# Altium footprint library 排针-排母-1.27.PcbLib: 152 footprints (part 3 of 10)
Each footprint in its own frame and in the unit in brackets; x right, y up, seen from the top. Pads: shape width x height; smd on the part's side, far side on the other; paste and mask are expansions set on the pad; w line width, h text height; cw(c..) or ccw(c..) is an arc to the next point about the centre after c.
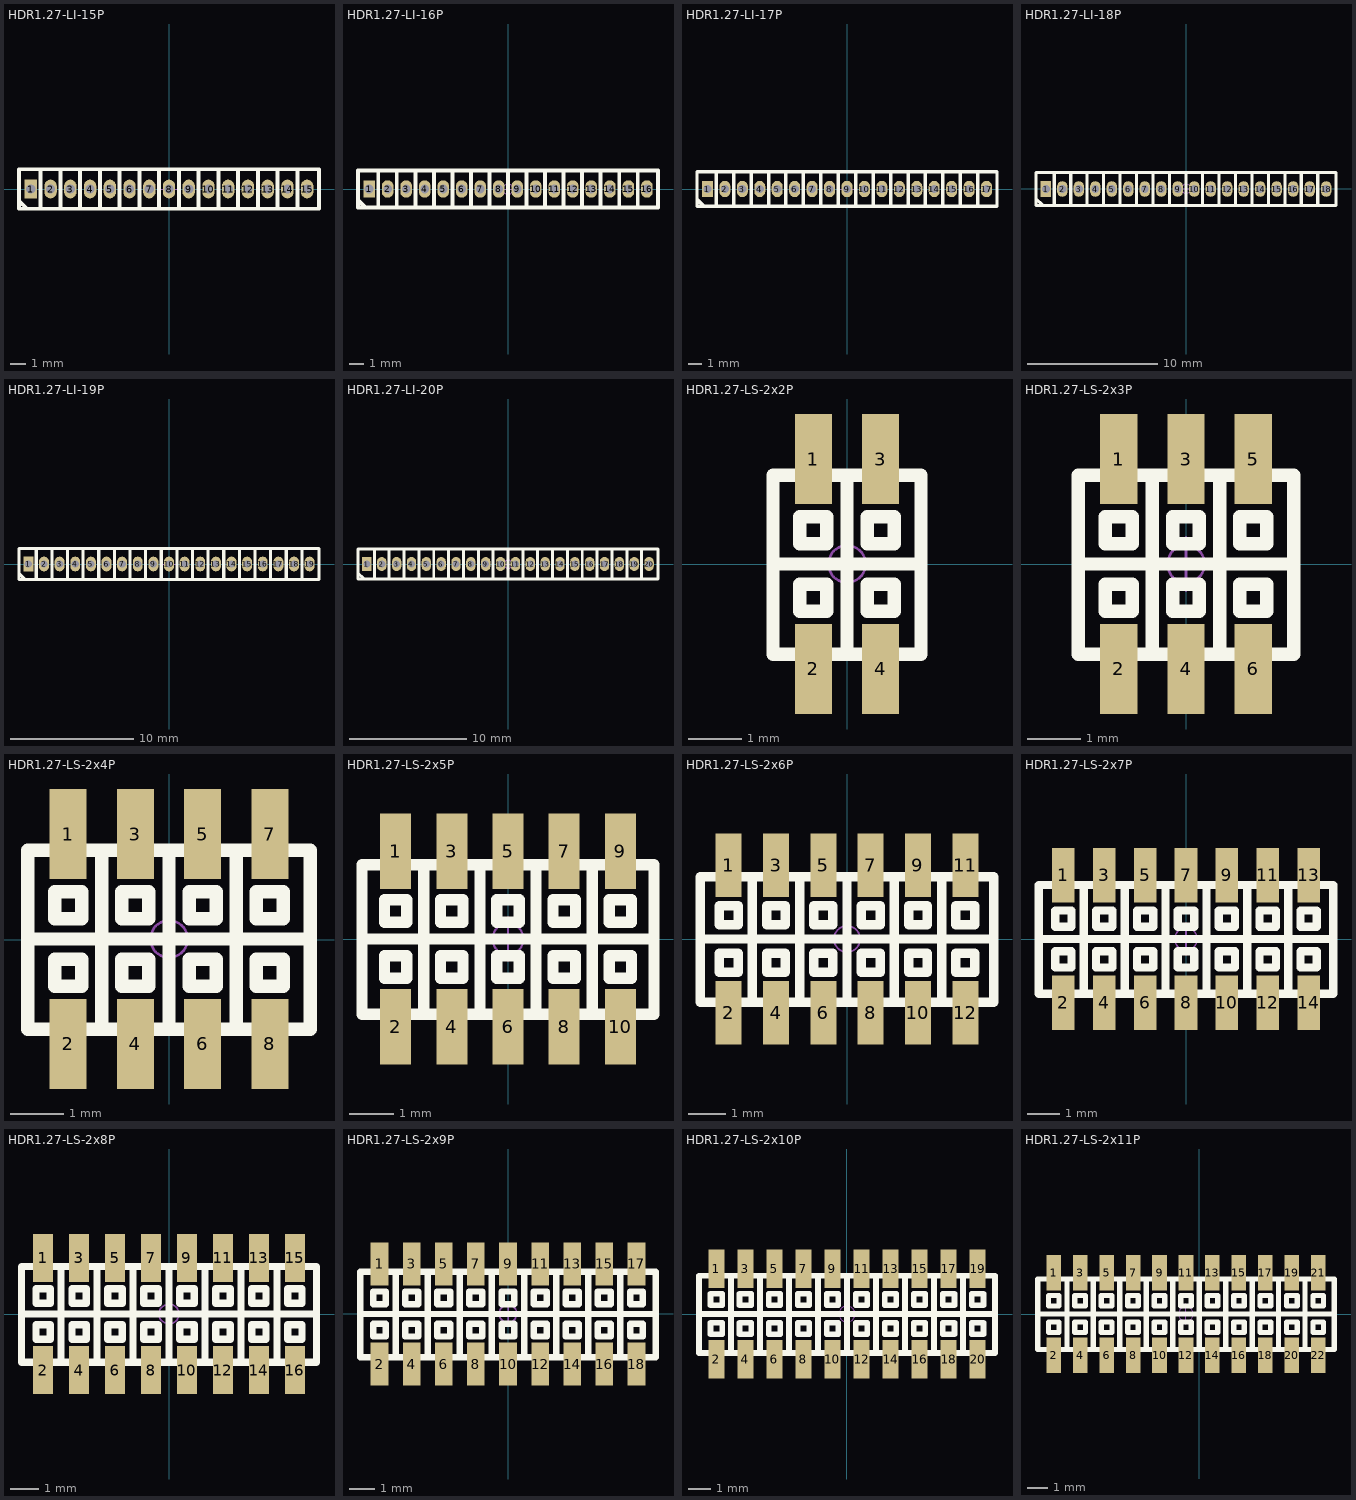
[diagram p2: the footprints below, top view; thin cyan lines are the x and y axes]

## HDR1.27-LI-15P [mm] "直插，脚距：1.27mm"
pads (15):
  rect 0.8x1.2 hole 0.6: 1(-8.89,0)
  oval 0.8x1.2 hole 0.6: 2(-7.62,0) 3(-6.35,0) 4(-5.08,0) 5(-3.81,0) 6(-2.54,0) 7(-1.27,0) 8(0,0) 9(1.27,0) 10(2.54,0) 11(3.81,0) 12(5.08,0) 13(6.35,0) 14(7.62,0) 15(8.89,0)
Top Overlay:
  lines w0.254: -9.652,-0.762 -9.144,-1.27 ; -8.255,-1.27 -8.255,1.27 ; -6.985,-1.27 -6.985,1.2 ; -5.715,-1.2 -5.715,1.27 ; -4.445,1.27 -4.445,-1.235 ; -3.175,-1.235 -3.175,1.27 ; -1.905,-1.27 -1.905,1.235 ; -0.635,-1.235 -0.635,1.27 ; 0.635,-1.27 0.635,1.235 ; 1.905,-1.235 1.905,1.27 ; 3.175,-1.27 3.175,1.235 ; 4.445,-1.235 4.445,1.27 ; 5.715,-1.27 5.715,1.235 ; 6.985,-1.235 6.985,1.27 ; 8.255,-1.27 8.255,1.235 ; -4.445,-1.235 -4.445,-1.235 ; -9.652,-1.27 -9.652,1.27 9.652,1.27 9.652,-1.27 -9.652,-1.27
Mechanical 15:
  circle w0.05: c0,0 r0.35
  lines w0.05: -0.5,0 0.5,0 ; 0,-0.5 0,0.5
3D body: height 4.48, standoff -2.72, extent -9.525,-1.2 9.525,1.2

## HDR1.27-LI-16P [mm] "直插，脚距：1.27mm"
pads (16):
  rect 0.8x1.2 hole 0.6: 1(-9.525,0.017)
  oval 0.8x1.2 hole 0.6: 2(-8.255,0.017) 3(-6.985,0.017) 4(-5.715,0.017) 5(-4.445,0.017) 6(-3.175,0.017) 7(-1.905,0.017) 8(-0.635,0.017) 9(0.635,0.017) 10(1.905,0.017) 11(3.175,0.017) 12(4.445,0.017) 13(5.715,0.017) 14(6.985,0.017) 15(8.255,0.017) 16(9.525,0.017)
Top Overlay:
  lines w0.254: -10.287,-0.745 -9.779,-1.253 ; -8.89,-1.253 -8.89,1.287 ; -7.62,-1.253 -7.62,1.217 ; -6.35,-1.182 -6.35,1.287 ; -5.08,1.287 -5.08,-1.218 ; -3.81,-1.218 -3.81,1.287 ; -2.54,-1.253 -2.54,1.253 ; -1.27,-1.218 -1.27,1.287 ; 0,-1.253 0,1.253 ; 1.27,-1.218 1.27,1.287 ; 2.54,-1.253 2.54,1.253 ; 3.81,-1.218 3.81,1.287 ; 5.08,-1.253 5.08,1.253 ; 6.35,-1.218 6.35,1.287 ; 7.62,-1.253 7.62,1.253 ; 8.89,-1.218 8.89,1.287 ; -5.08,-1.218 -5.08,-1.218 ; -10.287,-1.253 10.287,-1.253 10.287,1.287 -10.287,1.287 -10.287,-1.253
Mechanical 15:
  circle w0.05: c0,0 r0.35
  lines w0.05: -0.5,0 0.5,0 ; 0,-0.5 0,0.5
3D body: height 4.48, standoff -2.72, extent -10.16,-1.2 10.16,1.2

## HDR1.27-LI-17P [mm] "直插，脚距：1.27mm"
pads (17):
  rect 0.8x1.2 hole 0.6: 1(-10.16,0)
  oval 0.8x1.2 hole 0.6: 2(-8.89,0) 3(-7.62,0) 4(-6.35,0) 5(-5.08,0) 6(-3.81,0) 7(-2.54,0) 8(-1.27,0) 9(0,0) 10(1.27,0) 11(2.54,0) 12(3.81,0) 13(5.08,0) 14(6.35,0) 15(7.62,0) 16(8.89,0) 17(10.16,0)
Top Overlay:
  lines w0.254: -10.922,-0.762 -10.414,-1.27 ; -9.525,-1.27 -9.525,1.27 ; -8.255,-1.27 -8.255,1.2 ; -6.985,-1.2 -6.985,1.27 ; -5.715,1.27 -5.715,-1.235 ; -4.445,-1.235 -4.445,1.27 ; -3.175,-1.27 -3.175,1.235 ; -1.905,-1.235 -1.905,1.27 ; -0.635,-1.27 -0.635,1.235 ; 0.635,-1.235 0.635,1.27 ; 1.905,-1.27 1.905,1.235 ; 3.175,-1.235 3.175,1.27 ; 4.445,-1.27 4.445,1.235 ; 5.715,-1.235 5.715,1.27 ; 6.985,-1.27 6.985,1.235 ; 8.255,-1.235 8.255,1.27 ; 9.525,-1.235 9.525,1.27 ; -5.715,-1.235 -5.715,-1.235 ; -10.922,-1.27 10.922,-1.27 10.922,1.27 -10.922,1.27 -10.922,-1.27
Mechanical 15:
  circle w0.05: c0,0 r0.35
  lines w0.05: -0.5,0 0.5,0 ; 0,-0.5 0,0.5
3D body: height 4.48, standoff -2.72, extent -10.795,-1.2 10.795,1.2

## HDR1.27-LI-18P [mm] "直插，脚距：1.27mm"
pads (18):
  rect 0.8x1.2 hole 0.6: 1(-10.795,-0.017)
  oval 0.8x1.2 hole 0.6: 2(-9.525,-0.017) 3(-8.255,-0.017) 4(-6.985,-0.017) 5(-5.715,-0.017) 6(-4.445,-0.017) 7(-3.175,-0.017) 8(-1.905,-0.017) 9(-0.635,-0.017) 10(0.635,-0.017) 11(1.905,-0.017) 12(3.175,-0.017) 13(4.445,-0.017) 14(5.715,-0.017) 15(6.985,-0.017) 16(8.255,-0.017) 17(9.525,-0.017) 18(10.795,-0.017)
Top Overlay:
  lines w0.254: -11.557,-0.779 -11.049,-1.287 ; -10.16,-1.287 -10.16,1.253 ; -8.89,-1.287 -8.89,1.183 ; -7.62,-1.217 -7.62,1.253 ; -6.35,1.253 -6.35,-1.253 ; -5.08,-1.253 -5.08,1.253 ; -3.81,-1.287 -3.81,1.218 ; -2.54,-1.253 -2.54,1.253 ; -1.27,-1.287 -1.27,1.218 ; 0,-1.253 0,1.253 ; 1.27,-1.287 1.27,1.218 ; 2.54,-1.253 2.54,1.253 ; 3.81,-1.287 3.81,1.218 ; 5.08,-1.253 5.08,1.253 ; 6.35,-1.287 6.35,1.218 ; 7.62,-1.253 7.62,1.253 ; 8.89,-1.253 8.89,1.253 ; 10.16,-1.253 10.16,1.253 ; -6.35,-1.253 -6.35,-1.253 ; -11.557,-1.287 -11.557,1.253 11.557,1.253 11.557,-1.287 -11.557,-1.287
Mechanical 15:
  circle w0.05: c0,0 r0.35
  lines w0.05: -0.5,0 0.5,0 ; 0,-0.5 0,0.5
3D body: height 4.48, standoff -2.72, extent -11.43,-1.2 11.43,1.2

## HDR1.27-LI-19P [mm] "直插，脚距：1.27mm"
pads (19):
  rect 0.8x1.2 hole 0.6: 1(-11.43,0)
  oval 0.8x1.2 hole 0.6: 2(-10.16,0) 3(-8.89,0) 4(-7.62,0) 5(-6.35,0) 6(-5.08,0) 7(-3.81,0) 8(-2.54,0) 9(-1.27,0) 10(0,0) 11(1.27,0) 12(2.54,0) 13(3.81,0) 14(5.08,0) 15(6.35,0) 16(7.62,0) 17(8.89,0) 18(10.16,0) 19(11.43,0)
Top Overlay:
  lines w0.254: -12.192,-0.762 -11.684,-1.27 ; -10.795,-1.27 -10.795,1.27 ; -9.525,-1.27 -9.525,1.2 ; -8.255,-1.2 -8.255,1.27 ; -6.985,1.27 -6.985,-1.235 ; -5.715,-1.235 -5.715,1.27 ; -4.445,-1.27 -4.445,1.235 ; -3.175,-1.235 -3.175,1.27 ; -1.905,-1.27 -1.905,1.235 ; -0.635,-1.235 -0.635,1.27 ; 0.635,-1.27 0.635,1.235 ; 1.905,-1.235 1.905,1.27 ; 3.175,-1.27 3.175,1.235 ; 4.445,-1.235 4.445,1.27 ; 5.715,-1.27 5.715,1.235 ; 6.985,-1.235 6.985,1.27 ; 8.255,-1.235 8.255,1.27 ; 9.525,-1.235 9.525,1.27 ; 10.795,-1.235 10.795,1.27 ; -6.985,-1.235 -6.985,-1.235 ; -12.192,-1.27 -12.192,1.27 12.192,1.27 12.192,-1.27 -12.192,-1.27
Mechanical 15:
  circle w0.05: c0,0 r0.35
  lines w0.05: -0.5,0 0.5,0 ; 0,-0.5 0,0.5
3D body: height 4.48, standoff -2.72, extent -12.065,-1.2 12.065,1.2

## HDR1.27-LI-20P [mm] "直插，脚距：1.27mm"
pads (20):
  rect 0.8x1.2 hole 0.6: 1(-12.065,0.017)
  oval 0.8x1.2 hole 0.6: 2(-10.795,0.017) 3(-9.525,0.017) 4(-8.255,0.017) 5(-6.985,0.017) 6(-5.715,0.017) 7(-4.445,0.017) 8(-3.175,0.017) 9(-1.905,0.017) 10(-0.635,0.017) 11(0.635,0.017) 12(1.905,0.017) 13(3.175,0.017) 14(4.445,0.017) 15(5.715,0.017) 16(6.985,0.017) 17(8.255,0.017) 18(9.525,0.017) 19(10.795,0.017) 20(12.065,0.017)
Top Overlay:
  lines w0.254: -12.827,-0.745 -12.319,-1.253 ; -11.43,-1.253 -11.43,1.287 ; -10.16,-1.253 -10.16,1.217 ; -8.89,-1.182 -8.89,1.287 ; -7.62,1.287 -7.62,-1.218 ; -6.35,-1.218 -6.35,1.287 ; -5.08,-1.253 -5.08,1.253 ; -3.81,-1.218 -3.81,1.287 ; -2.54,-1.253 -2.54,1.253 ; -1.27,-1.218 -1.27,1.287 ; 0,-1.253 0,1.253 ; 1.27,-1.218 1.27,1.287 ; 2.54,-1.253 2.54,1.253 ; 3.81,-1.218 3.81,1.287 ; 5.08,-1.253 5.08,1.253 ; 6.35,-1.218 6.35,1.287 ; 7.62,-1.218 7.62,1.287 ; 8.89,-1.218 8.89,1.287 ; 10.16,-1.218 10.16,1.287 ; 11.43,-1.218 11.43,1.287 ; -7.62,-1.218 -7.62,-1.218 ; -12.827,-1.253 -12.827,1.287 12.827,1.287 12.827,-1.253 -12.827,-1.253
Mechanical 15:
  circle w0.05: c0,0 r0.35
  lines w0.05: -0.5,0 0.5,0 ; 0,-0.5 0,0.5
3D body: height 4.48, standoff -2.72, extent -12.7,-1.2 12.7,1.2

## HDR1.27-LS-2x2P [mm] "双排贴片排针，脚距：1.27mm"
pads (4):
  rect 0.7x1.7 smd: 1(-0.635,1.981) 2(-0.635,-1.981) 3(0.635,1.981) 4(0.635,-1.981)
Top Overlay:
  lines w0.254: -1.397,0 1.397,0 ; 0,-1.702 0,1.676 ; -1.397,-1.702 -1.397,1.676 1.397,1.676 1.397,-1.702 -1.397,-1.702 ; -0.889,-0.889 -0.381,-0.889 -0.381,-0.381 -0.889,-0.381 -0.889,-0.889 ; -0.889,0.381 -0.889,0.889 -0.381,0.889 -0.381,0.381 -0.889,0.381 ; 0.381,-0.889 0.381,-0.381 0.889,-0.381 0.889,-0.889 0.381,-0.889 ; 0.381,0.381 0.889,0.381 0.889,0.889 0.381,0.889 0.381,0.381
Mechanical 15:
  circle w0.05: c0,0 r0.35
  lines w0.05: -0.5,0 0.5,0 ; 0,-0.5 0,0.5
3D body: height 4.25, standoff 0.04, extent 0,-2.75 1.27,2.75
3D body: height 4.25, standoff 0.04, extent -1.27,-2.75 0,2.75

## HDR1.27-LS-2x3P [mm] "双排贴片排针，脚距：1.27mm"
pads (6):
  rect 0.7x1.7 smd: 1(-1.27,1.981) 2(-1.27,-1.981) 3(0,1.981) 4(0,-1.981) 5(1.27,1.981) 6(1.27,-1.981)
Top Overlay:
  lines w0.254: -2.032,0 2.032,0 ; -0.635,-1.702 -0.635,1.676 ; 0.635,-1.702 0.635,1.676 ; -2.032,-1.702 2.032,-1.702 2.032,1.676 -2.032,1.676 -2.032,-1.702 ; -1.524,-0.889 -1.524,-0.381 -1.016,-0.381 -1.016,-0.889 -1.524,-0.889 ; -1.524,0.381 -1.016,0.381 -1.016,0.889 -1.524,0.889 -1.524,0.381 ; -0.254,-0.889 0.254,-0.889 0.254,-0.381 -0.254,-0.381 -0.254,-0.889 ; -0.254,0.381 -0.254,0.889 0.254,0.889 0.254,0.381 -0.254,0.381 ; 1.016,-0.889 1.524,-0.889 1.524,-0.381 1.016,-0.381 1.016,-0.889 ; 1.016,0.381 1.016,0.889 1.524,0.889 1.524,0.381 1.016,0.381
Mechanical 15:
  circle w0.05: c0,0 r0.35
  lines w0.05: -0.5,0 0.5,0 ; 0,-0.5 0,0.5
3D body: height 4.25, standoff 0.04, extent -1.905,-2.75 -0.635,2.75
3D body: height 4.25, standoff 0.04, extent -0.635,-2.75 0.635,2.75
3D body: height 4.25, standoff 0.04, extent 0.635,-2.75 1.905,2.75

## HDR1.27-LS-2x4P [mm] "双排贴片排针，脚距：1.27mm"
pads (8):
  rect 0.7x1.7 smd: 1(-1.905,1.994) 2(-1.905,-1.968) 3(-0.635,1.994) 4(-0.635,-1.968) 5(0.635,1.994) 6(0.635,-1.968) 7(1.905,1.994) 8(1.905,-1.968)
Top Overlay:
  lines w0.254: -2.667,0.013 2.667,0.013 ; -1.27,-1.689 -1.27,1.689 ; 0,-1.689 0,1.689 ; 1.27,-1.689 1.27,1.689 ; -2.667,-1.689 2.667,-1.689 2.667,1.689 -2.667,1.689 -2.667,-1.689 ; -2.159,-0.876 -2.159,-0.368 -1.651,-0.368 -1.651,-0.876 -2.159,-0.876 ; -2.159,0.394 -1.651,0.394 -1.651,0.902 -2.159,0.902 -2.159,0.394 ; -0.889,-0.876 -0.381,-0.876 -0.381,-0.368 -0.889,-0.368 -0.889,-0.876 ; -0.889,0.394 -0.889,0.902 -0.381,0.902 -0.381,0.394 -0.889,0.394 ; 0.381,-0.876 0.889,-0.876 0.889,-0.368 0.381,-0.368 0.381,-0.876 ; 0.381,0.394 0.381,0.902 0.889,0.902 0.889,0.394 0.381,0.394 ; 1.651,-0.876 2.159,-0.876 2.159,-0.368 1.651,-0.368 1.651,-0.876 ; 1.651,0.394 1.651,0.902 2.159,0.902 2.159,0.394 1.651,0.394
Mechanical 15:
  circle w0.05: c0,0.013 r0.35
  lines w0.05: -0.5,0.013 0.5,0.013 ; 0,-0.487 0,0.513
3D body: height 4.25, standoff 0.04, extent -2.54,-2.737 -1.27,2.763
3D body: height 4.25, standoff 0.04, extent -1.27,-2.737 0,2.763
3D body: height 4.25, standoff 0.04, extent 0,-2.737 1.27,2.763
3D body: height 4.25, standoff 0.04, extent 1.27,-2.737 2.54,2.763

## HDR1.27-LS-2x5P [mm] "双排贴片排针，脚距：1.27mm"
pads (10):
  rect 0.7x1.7 smd: 1(-2.54,1.981) 2(-2.54,-1.981) 3(-1.27,1.981) 4(-1.27,-1.981) 5(0,1.981) 6(0,-1.981) 7(1.27,1.981) 8(1.27,-1.981) 9(2.54,1.981) 10(2.54,-1.981)
Top Overlay:
  lines w0.254: -3.302,0 3.302,0 ; -1.905,-1.702 -1.905,1.676 ; -0.635,-1.702 -0.635,1.676 ; 0.635,-1.702 0.635,1.676 ; 1.905,-1.702 1.905,1.676 ; -3.302,-1.702 -3.302,1.676 3.302,1.676 3.302,-1.702 -3.302,-1.702 ; -2.794,-0.889 -2.286,-0.889 -2.286,-0.381 -2.794,-0.381 -2.794,-0.889 ; -2.794,0.381 -2.794,0.889 -2.286,0.889 -2.286,0.381 -2.794,0.381 ; -1.524,-0.889 -1.524,-0.381 -1.016,-0.381 -1.016,-0.889 -1.524,-0.889 ; -1.524,0.381 -1.016,0.381 -1.016,0.889 -1.524,0.889 -1.524,0.381 ; -0.254,-0.889 -0.254,-0.381 0.254,-0.381 0.254,-0.889 -0.254,-0.889 ; -0.254,0.381 0.254,0.381 0.254,0.889 -0.254,0.889 -0.254,0.381 ; 1.016,-0.889 1.016,-0.381 1.524,-0.381 1.524,-0.889 1.016,-0.889 ; 1.016,0.381 1.524,0.381 1.524,0.889 1.016,0.889 1.016,0.381 ; 2.286,-0.889 2.286,-0.381 2.794,-0.381 2.794,-0.889 2.286,-0.889 ; 2.286,0.381 2.794,0.381 2.794,0.889 2.286,0.889 2.286,0.381
Mechanical 15:
  circle w0.05: c0,0 r0.35
  lines w0.05: -0.5,0 0.5,0 ; 0,-0.5 0,0.5
3D body: height 4.25, standoff 0.04, extent 1.905,-2.75 3.175,2.75
3D body: height 4.25, standoff 0.04, extent 0.635,-2.75 1.905,2.75
3D body: height 4.25, standoff 0.04, extent -0.635,-2.75 0.635,2.75
3D body: height 4.25, standoff 0.04, extent -1.905,-2.75 -0.635,2.75
3D body: height 4.25, standoff 0.04, extent -3.175,-2.75 -1.905,2.75

## HDR1.27-LS-2x6P [mm] "双排贴片排针，脚距：1.27mm"
pads (12):
  rect 0.7x1.7 smd: 1(-3.175,1.981) 2(-3.175,-1.981) 3(-1.905,1.981) 4(-1.905,-1.981) 5(-0.635,1.981) 6(-0.635,-1.981) 7(0.635,1.981) 8(0.635,-1.981) 9(1.905,1.981) 10(1.905,-1.981) 11(3.175,1.981) 12(3.175,-1.981)
Top Overlay:
  lines w0.254: -3.937,0 3.937,0 ; -2.54,-1.702 -2.54,1.676 ; -1.27,-1.702 -1.27,1.676 ; 0,-1.702 0,1.676 ; 1.27,-1.702 1.27,1.676 ; 2.54,-1.702 2.54,1.676 ; -3.937,-1.702 -3.937,1.676 3.937,1.676 3.937,-1.702 -3.937,-1.702 ; -3.429,-0.889 -2.921,-0.889 -2.921,-0.381 -3.429,-0.381 -3.429,-0.889 ; -3.429,0.381 -3.429,0.889 -2.921,0.889 -2.921,0.381 -3.429,0.381 ; -2.159,-0.889 -2.159,-0.381 -1.651,-0.381 -1.651,-0.889 -2.159,-0.889 ; -2.159,0.381 -1.651,0.381 -1.651,0.889 -2.159,0.889 -2.159,0.381 ; -0.889,-0.889 -0.889,-0.381 -0.381,-0.381 -0.381,-0.889 -0.889,-0.889 ; -0.889,0.381 -0.381,0.381 -0.381,0.889 -0.889,0.889 -0.889,0.381 ; 0.381,-0.889 0.381,-0.381 0.889,-0.381 0.889,-0.889 0.381,-0.889 ; 0.381,0.381 0.889,0.381 0.889,0.889 0.381,0.889 0.381,0.381 ; 1.651,-0.889 1.651,-0.381 2.159,-0.381 2.159,-0.889 1.651,-0.889 ; 1.651,0.381 2.159,0.381 2.159,0.889 1.651,0.889 1.651,0.381 ; 2.921,-0.889 2.921,-0.381 3.429,-0.381 3.429,-0.889 2.921,-0.889 ; 2.921,0.381 3.429,0.381 3.429,0.889 2.921,0.889 2.921,0.381
Mechanical 15:
  circle w0.05: c0,0 r0.35
  lines w0.05: -0.5,0 0.5,0 ; 0,-0.5 0,0.5
3D body: height 4.25, standoff 0.04, extent 2.54,-2.75 3.81,2.75
3D body: height 4.25, standoff 0.04, extent 1.27,-2.75 2.54,2.75
3D body: height 4.25, standoff 0.04, extent 0,-2.75 1.27,2.75
3D body: height 4.25, standoff 0.04, extent -1.27,-2.75 0,2.75
3D body: height 4.25, standoff 0.04, extent -2.54,-2.75 -1.27,2.75
3D body: height 4.25, standoff 0.04, extent -3.81,-2.75 -2.54,2.75

## HDR1.27-LS-2x7P [mm] "双排贴片排针，脚距：1.27mm"
pads (14):
  rect 0.7x1.7 smd: 1(-3.81,1.981) 2(-3.81,-1.981) 3(-2.54,1.981) 4(-2.54,-1.981) 5(-1.27,1.981) 6(-1.27,-1.981) 7(0,1.981) 8(0,-1.981) 9(1.27,1.981) 10(1.27,-1.981) 11(2.54,1.981) 12(2.54,-1.981) 13(3.81,1.981) 14(3.81,-1.981)
Top Overlay:
  lines w0.254: -4.572,0 4.572,0 ; -3.175,-1.702 -3.175,1.676 ; -1.905,-1.702 -1.905,1.676 ; -0.635,-1.702 -0.635,1.676 ; 0.635,-1.702 0.635,1.676 ; 1.905,-1.702 1.905,1.676 ; 3.175,-1.702 3.175,1.676 ; -4.572,-1.702 4.572,-1.702 4.572,1.676 -4.572,1.676 -4.572,-1.702 ; -4.064,-0.889 -4.064,-0.381 -3.556,-0.381 -3.556,-0.889 -4.064,-0.889 ; -4.064,0.381 -3.556,0.381 -3.556,0.889 -4.064,0.889 -4.064,0.381 ; -2.794,-0.889 -2.286,-0.889 -2.286,-0.381 -2.794,-0.381 -2.794,-0.889 ; -2.794,0.381 -2.794,0.889 -2.286,0.889 -2.286,0.381 -2.794,0.381 ; -1.524,-0.889 -1.016,-0.889 -1.016,-0.381 -1.524,-0.381 -1.524,-0.889 ; -1.524,0.381 -1.524,0.889 -1.016,0.889 -1.016,0.381 -1.524,0.381 ; -0.254,-0.889 0.254,-0.889 0.254,-0.381 -0.254,-0.381 -0.254,-0.889 ; -0.254,0.381 -0.254,0.889 0.254,0.889 0.254,0.381 -0.254,0.381 ; 1.016,-0.889 1.524,-0.889 1.524,-0.381 1.016,-0.381 1.016,-0.889 ; 1.016,0.381 1.016,0.889 1.524,0.889 1.524,0.381 1.016,0.381 ; 2.286,-0.889 2.794,-0.889 2.794,-0.381 2.286,-0.381 2.286,-0.889 ; 2.286,0.381 2.286,0.889 2.794,0.889 2.794,0.381 2.286,0.381 ; 3.556,-0.889 4.064,-0.889 4.064,-0.381 3.556,-0.381 3.556,-0.889 ; 3.556,0.381 3.556,0.889 4.064,0.889 4.064,0.381 3.556,0.381
Mechanical 15:
  circle w0.05: c0,0 r0.35
  lines w0.05: -0.5,0 0.5,0 ; 0,-0.5 0,0.5
3D body: height 4.25, standoff 0.04, extent -4.445,-2.75 -3.175,2.75
3D body: height 4.25, standoff 0.04, extent -3.175,-2.75 -1.905,2.75
3D body: height 4.25, standoff 0.04, extent -1.905,-2.75 -0.635,2.75
3D body: height 4.25, standoff 0.04, extent -0.635,-2.75 0.635,2.75
3D body: height 4.25, standoff 0.04, extent 0.635,-2.75 1.905,2.75
3D body: height 4.25, standoff 0.04, extent 1.905,-2.75 3.175,2.75
3D body: height 4.25, standoff 0.04, extent 3.175,-2.75 4.445,2.75

## HDR1.27-LS-2x8P [mm] "双排贴片排针，脚距：1.27mm"
pads (16):
  rect 0.7x1.7 smd: 1(-4.445,1.994) 2(-4.445,-1.968) 3(-3.175,1.994) 4(-3.175,-1.968) 5(-1.905,1.994) 6(-1.905,-1.968) 7(-0.635,1.994) 8(-0.635,-1.968) 9(0.635,1.994) 10(0.635,-1.968) 11(1.905,1.994) 12(1.905,-1.968) 13(3.175,1.994) 14(3.175,-1.968) 15(4.445,1.994) 16(4.445,-1.968)
Top Overlay:
  lines w0.254: -5.207,0.013 5.207,0.013 ; -3.81,-1.689 -3.81,1.689 ; -2.54,-1.689 -2.54,1.689 ; -1.27,-1.689 -1.27,1.689 ; 0,-1.689 0,1.689 ; 1.27,-1.689 1.27,1.689 ; 2.54,-1.689 2.54,1.689 ; 3.81,-1.689 3.81,1.689 ; -5.207,-1.689 5.207,-1.689 5.207,1.689 -5.207,1.689 -5.207,-1.689 ; -4.699,-0.876 -4.699,-0.368 -4.191,-0.368 -4.191,-0.876 -4.699,-0.876 ; -4.699,0.394 -4.191,0.394 -4.191,0.902 -4.699,0.902 -4.699,0.394 ; -3.429,-0.876 -2.921,-0.876 -2.921,-0.368 -3.429,-0.368 -3.429,-0.876 ; -3.429,0.394 -3.429,0.902 -2.921,0.902 -2.921,0.394 -3.429,0.394 ; -2.159,-0.876 -1.651,-0.876 -1.651,-0.368 -2.159,-0.368 -2.159,-0.876 ; -2.159,0.394 -2.159,0.902 -1.651,0.902 -1.651,0.394 -2.159,0.394 ; -0.889,-0.876 -0.381,-0.876 -0.381,-0.368 -0.889,-0.368 -0.889,-0.876 ; -0.889,0.394 -0.889,0.902 -0.381,0.902 -0.381,0.394 -0.889,0.394 ; 0.381,-0.876 0.889,-0.876 0.889,-0.368 0.381,-0.368 0.381,-0.876 ; 0.381,0.394 0.381,0.902 0.889,0.902 0.889,0.394 0.381,0.394 ; 1.651,-0.876 2.159,-0.876 2.159,-0.368 1.651,-0.368 1.651,-0.876 ; 1.651,0.394 1.651,0.902 2.159,0.902 2.159,0.394 1.651,0.394 ; 2.921,-0.876 3.429,-0.876 3.429,-0.368 2.921,-0.368 2.921,-0.876 ; 2.921,0.394 2.921,0.902 3.429,0.902 3.429,0.394 2.921,0.394 ; 4.191,-0.876 4.699,-0.876 4.699,-0.368 4.191,-0.368 4.191,-0.876 ; 4.191,0.394 4.191,0.902 4.699,0.902 4.699,0.394 4.191,0.394
Mechanical 15:
  circle w0.05: c0,0.013 r0.35
  lines w0.05: -0.5,0.013 0.5,0.013 ; 0,-0.487 0,0.513
3D body: height 4.25, standoff 0.04, extent -5.08,-2.737 -3.81,2.763
3D body: height 4.25, standoff 0.04, extent -3.81,-2.737 -2.54,2.763
3D body: height 4.25, standoff 0.04, extent -2.54,-2.737 -1.27,2.763
3D body: height 4.25, standoff 0.04, extent -1.27,-2.737 0,2.763
3D body: height 4.25, standoff 0.04, extent 0,-2.737 1.27,2.763
3D body: height 4.25, standoff 0.04, extent 1.27,-2.737 2.54,2.763
3D body: height 4.25, standoff 0.04, extent 2.54,-2.737 3.81,2.763
3D body: height 4.25, standoff 0.04, extent 3.81,-2.737 5.08,2.763

## HDR1.27-LS-2x9P [mm] "双排贴片排针，脚距：1.27mm"
pads (18):
  rect 0.7x1.7 smd: 1(-5.08,1.968) 2(-5.08,-1.994) 3(-3.81,1.968) 4(-3.81,-1.994) 5(-2.54,1.968) 6(-2.54,-1.994) 7(-1.27,1.968) 8(-1.27,-1.994) 9(0,1.968) 10(0,-1.994) 11(1.27,1.968) 12(1.27,-1.994) 13(2.54,1.968) 14(2.54,-1.994) 15(3.81,1.968) 16(3.81,-1.994) 17(5.08,1.968) 18(5.08,-1.994)
Top Overlay:
  lines w0.254: -5.842,-0.013 5.842,-0.013 ; -4.445,-1.714 -4.445,1.664 ; -3.175,-1.714 -3.175,1.664 ; -1.905,-1.714 -1.905,1.664 ; -0.635,-1.714 -0.635,1.664 ; 0.635,-1.714 0.635,1.664 ; 1.905,-1.714 1.905,1.664 ; 3.175,-1.714 3.175,1.664 ; 4.445,-1.714 4.445,1.664 ; -5.842,-1.714 -5.842,1.664 5.842,1.664 5.842,-1.714 -5.842,-1.714 ; -5.334,-0.902 -4.826,-0.902 -4.826,-0.394 -5.334,-0.394 -5.334,-0.902 ; -5.334,0.368 -5.334,0.876 -4.826,0.876 -4.826,0.368 -5.334,0.368 ; -4.064,-0.902 -4.064,-0.394 -3.556,-0.394 -3.556,-0.902 -4.064,-0.902 ; -4.064,0.368 -3.556,0.368 -3.556,0.876 -4.064,0.876 -4.064,0.368 ; -2.794,-0.902 -2.794,-0.394 -2.286,-0.394 -2.286,-0.902 -2.794,-0.902 ; -2.794,0.368 -2.286,0.368 -2.286,0.876 -2.794,0.876 -2.794,0.368 ; -1.524,-0.902 -1.524,-0.394 -1.016,-0.394 -1.016,-0.902 -1.524,-0.902 ; -1.524,0.368 -1.016,0.368 -1.016,0.876 -1.524,0.876 -1.524,0.368 ; -0.254,-0.902 -0.254,-0.394 0.254,-0.394 0.254,-0.902 -0.254,-0.902 ; -0.254,0.368 0.254,0.368 0.254,0.876 -0.254,0.876 -0.254,0.368 ; 1.016,-0.902 1.016,-0.394 1.524,-0.394 1.524,-0.902 1.016,-0.902 ; 1.016,0.368 1.524,0.368 1.524,0.876 1.016,0.876 1.016,0.368 ; 2.286,-0.902 2.286,-0.394 2.794,-0.394 2.794,-0.902 2.286,-0.902 ; 2.286,0.368 2.794,0.368 2.794,0.876 2.286,0.876 2.286,0.368 ; 3.556,-0.902 3.556,-0.394 4.064,-0.394 4.064,-0.902 3.556,-0.902 ; 3.556,0.368 4.064,0.368 4.064,0.876 3.556,0.876 3.556,0.368 ; 4.826,-0.902 4.826,-0.394 5.334,-0.394 5.334,-0.902 4.826,-0.902 ; 4.826,0.368 5.334,0.368 5.334,0.876 4.826,0.876 4.826,0.368
Mechanical 15:
  circle w0.05: c0,0 r0.35
  lines w0.05: -0.5,0 0.5,0 ; 0,-0.5 0,0.5
3D body: height 4.25, standoff 0.04, extent 4.445,-2.763 5.715,2.737
3D body: height 4.25, standoff 0.04, extent 3.175,-2.763 4.445,2.737
3D body: height 4.25, standoff 0.04, extent 1.905,-2.763 3.175,2.737
3D body: height 4.25, standoff 0.04, extent 0.635,-2.763 1.905,2.737
3D body: height 4.25, standoff 0.04, extent -0.635,-2.763 0.635,2.737
3D body: height 4.25, standoff 0.04, extent -1.905,-2.763 -0.635,2.737
3D body: height 4.25, standoff 0.04, extent -3.175,-2.763 -1.905,2.737
3D body: height 4.25, standoff 0.04, extent -4.445,-2.763 -3.175,2.737
3D body: height 4.25, standoff 0.04, extent -5.715,-2.763 -4.445,2.737

## HDR1.27-LS-2x10P [mm] "双排贴片排针，脚距：1.27mm"
pads (20):
  rect 0.7x1.7 smd: 1(-5.715,1.981) 2(-5.715,-1.981) 3(-4.445,1.981) 4(-4.445,-1.981) 5(-3.175,1.981) 6(-3.175,-1.981) 7(-1.905,1.981) 8(-1.905,-1.981) 9(-0.635,1.981) 10(-0.635,-1.981) 11(0.635,1.981) 12(0.635,-1.981) 13(1.905,1.981) 14(1.905,-1.981) 15(3.175,1.981) 16(3.175,-1.981) 17(4.445,1.981) 18(4.445,-1.981) 19(5.715,1.981) 20(5.715,-1.981)
Top Overlay:
  lines w0.254: -6.477,0 6.477,0 ; -5.08,-1.702 -5.08,1.676 ; -3.81,-1.702 -3.81,1.676 ; -2.54,-1.702 -2.54,1.676 ; -1.27,-1.702 -1.27,1.676 ; 0,-1.702 0,1.676 ; 1.27,-1.702 1.27,1.676 ; 2.54,-1.702 2.54,1.676 ; 3.81,-1.702 3.81,1.676 ; 5.08,-1.702 5.08,1.677 ; -6.477,-1.702 6.477,-1.702 6.477,1.676 -6.477,1.676 -6.477,-1.702 ; -5.969,-0.889 -5.969,-0.381 -5.461,-0.381 -5.461,-0.889 -5.969,-0.889 ; -5.969,0.381 -5.461,0.381 -5.461,0.889 -5.969,0.889 -5.969,0.381 ; -4.699,-0.889 -4.191,-0.889 -4.191,-0.381 -4.699,-0.381 -4.699,-0.889 ; -4.699,0.381 -4.699,0.889 -4.191,0.889 -4.191,0.381 -4.699,0.381 ; -3.429,-0.889 -2.921,-0.889 -2.921,-0.381 -3.429,-0.381 -3.429,-0.889 ; -3.429,0.381 -3.429,0.889 -2.921,0.889 -2.921,0.381 -3.429,0.381 ; -2.159,-0.889 -1.651,-0.889 -1.651,-0.381 -2.159,-0.381 -2.159,-0.889 ; -2.159,0.381 -2.159,0.889 -1.651,0.889 -1.651,0.381 -2.159,0.381 ; -0.889,-0.889 -0.381,-0.889 -0.381,-0.381 -0.889,-0.381 -0.889,-0.889 ; -0.889,0.381 -0.889,0.889 -0.381,0.889 -0.381,0.381 -0.889,0.381 ; 0.381,-0.889 0.889,-0.889 0.889,-0.381 0.381,-0.381 0.381,-0.889 ; 0.381,0.381 0.381,0.889 0.889,0.889 0.889,0.381 0.381,0.381 ; 1.651,-0.889 2.159,-0.889 2.159,-0.381 1.651,-0.381 1.651,-0.889 ; 1.651,0.381 1.651,0.889 2.159,0.889 2.159,0.381 1.651,0.381 ; 2.921,-0.889 3.429,-0.889 3.429,-0.381 2.921,-0.381 2.921,-0.889 ; 2.921,0.381 2.921,0.889 3.429,0.889 3.429,0.381 2.921,0.381 ; 4.191,-0.889 4.699,-0.889 4.699,-0.381 4.191,-0.381 4.191,-0.889 ; 4.191,0.381 4.191,0.889 4.699,0.889 4.699,0.381 4.191,0.381 ; 5.461,-0.889 5.461,-0.381 5.969,-0.381 5.969,-0.889 5.461,-0.889 ; 5.461,0.381 5.969,0.381 5.969,0.889 5.461,0.889 5.461,0.381
Mechanical 15:
  circle w0.05: c0,0 r0.35
  lines w0.05: -0.5,0 0.5,0 ; 0,-0.5 0,0.5
3D body: height 4.25, standoff 0.04, extent -6.35,-2.75 -5.08,2.75
3D body: height 4.25, standoff 0.04, extent -5.08,-2.75 -3.81,2.75
3D body: height 4.25, standoff 0.04, extent -3.81,-2.75 -2.54,2.75
3D body: height 4.25, standoff 0.04, extent -2.54,-2.75 -1.27,2.75
3D body: height 4.25, standoff 0.04, extent -1.27,-2.75 0,2.75
3D body: height 4.25, standoff 0.04, extent 0,-2.75 1.27,2.75
3D body: height 4.25, standoff 0.04, extent 1.27,-2.75 2.54,2.75
3D body: height 4.25, standoff 0.04, extent 2.54,-2.75 3.81,2.75
3D body: height 4.25, standoff 0.04, extent 3.81,-2.75 5.08,2.75
3D body: height 4.25, standoff 0.04, extent 5.08,-2.75 6.35,2.75

## HDR1.27-LS-2x11P [mm] "双排贴片排针，脚距：1.27mm"
pads (22):
  rect 0.7x1.7 smd: 1(-6.985,1.981) 2(-6.985,-1.981) 3(-5.715,1.981) 4(-5.715,-1.981) 5(-4.445,1.981) 6(-4.445,-1.981) 7(-3.175,1.981) 8(-3.175,-1.981) 9(-1.905,1.981) 10(-1.905,-1.981) 11(-0.635,1.981) 12(-0.635,-1.981) 13(0.635,1.981) 14(0.635,-1.981) 15(1.905,1.981) 16(1.905,-1.981) 17(3.175,1.981) 18(3.175,-1.981) 19(4.445,1.981) 20(4.445,-1.981) 21(5.715,1.981) 22(5.715,-1.981)
Top Overlay:
  lines w0.254: -7.747,0 6.477,0 ; -6.35,-1.702 -6.35,1.676 ; -5.08,-1.702 -5.08,1.676 ; -3.81,-1.702 -3.81,1.676 ; -2.54,-1.702 -2.54,1.676 ; -1.27,-1.702 -1.27,1.676 ; 0,-1.702 0,1.676 ; 1.27,-1.702 1.27,1.676 ; 2.54,-1.702 2.54,1.676 ; 3.81,-1.702 3.81,1.676 ; 5.08,-1.702 5.08,1.677 ; -7.747,-1.702 6.477,-1.702 6.477,1.676 -7.747,1.676 -7.747,-1.702 ; -7.239,-0.889 -7.239,-0.381 -6.731,-0.381 -6.731,-0.889 -7.239,-0.889 ; -7.239,0.381 -6.731,0.381 -6.731,0.889 -7.239,0.889 -7.239,0.381 ; -5.969,-0.889 -5.461,-0.889 -5.461,-0.381 -5.969,-0.381 -5.969,-0.889 ; -5.969,0.381 -5.969,0.889 -5.461,0.889 -5.461,0.381 -5.969,0.381 ; -4.699,-0.889 -4.191,-0.889 -4.191,-0.381 -4.699,-0.381 -4.699,-0.889 ; -4.699,0.381 -4.699,0.889 -4.191,0.889 -4.191,0.381 -4.699,0.381 ; -3.429,-0.889 -2.921,-0.889 -2.921,-0.381 -3.429,-0.381 -3.429,-0.889 ; -3.429,0.381 -3.429,0.889 -2.921,0.889 -2.921,0.381 -3.429,0.381 ; -2.159,-0.889 -1.651,-0.889 -1.651,-0.381 -2.159,-0.381 -2.159,-0.889 ; -2.159,0.381 -2.159,0.889 -1.651,0.889 -1.651,0.381 -2.159,0.381 ; -0.889,-0.889 -0.381,-0.889 -0.381,-0.381 -0.889,-0.381 -0.889,-0.889 ; -0.889,0.381 -0.889,0.889 -0.381,0.889 -0.381,0.381 -0.889,0.381 ; 0.381,-0.889 0.889,-0.889 0.889,-0.381 0.381,-0.381 0.381,-0.889 ; 0.381,0.381 0.381,0.889 0.889,0.889 0.889,0.381 0.381,0.381 ; 1.651,-0.889 2.159,-0.889 2.159,-0.381 1.651,-0.381 1.651,-0.889 ; 1.651,0.381 1.651,0.889 2.159,0.889 2.159,0.381 1.651,0.381 ; 2.921,-0.889 3.429,-0.889 3.429,-0.381 2.921,-0.381 2.921,-0.889 ; 2.921,0.381 2.921,0.889 3.429,0.889 3.429,0.381 2.921,0.381 ; 4.191,-0.889 4.699,-0.889 4.699,-0.381 4.191,-0.381 4.191,-0.889 ; 4.191,0.381 4.191,0.889 4.699,0.889 4.699,0.381 4.191,0.381 ; 5.461,-0.889 5.969,-0.889 5.969,-0.381 5.461,-0.381 5.461,-0.889 ; 5.461,0.381 5.461,0.889 5.969,0.889 5.969,0.381 5.461,0.381
Mechanical 15:
  circle w0.05: c-0.635,0 r0.35
  lines w0.05: -1.135,0 -0.135,0 ; -0.635,-0.5 -0.635,0.5
3D body: height 4.25, standoff 0.04, extent 5.08,-2.75 6.35,2.75
3D body: height 4.25, standoff 0.04, extent -7.62,-2.75 -6.35,2.75
3D body: height 4.25, standoff 0.04, extent -6.35,-2.75 -5.08,2.75
3D body: height 4.25, standoff 0.04, extent -5.08,-2.75 -3.81,2.75
3D body: height 4.25, standoff 0.04, extent -3.81,-2.75 -2.54,2.75
3D body: height 4.25, standoff 0.04, extent -2.54,-2.75 -1.27,2.75
3D body: height 4.25, standoff 0.04, extent -1.27,-2.75 0,2.75
3D body: height 4.25, standoff 0.04, extent 0,-2.75 1.27,2.75
3D body: height 4.25, standoff 0.04, extent 1.27,-2.75 2.54,2.75
3D body: height 4.25, standoff 0.04, extent 2.54,-2.75 3.81,2.75
3D body: height 4.25, standoff 0.04, extent 3.81,-2.75 5.08,2.75